# Altium footprint library ConnectorsTDH.PcbLib: 194 footprints (part 3 of 13)
Each footprint in its own frame and in the unit in brackets; x right, y up, seen from the top. Pads: shape width x height; smd on the part's side, far side on the other; paste and mask are expansions set on the pad; w line width, h text height; cw(c..) or ccw(c..) is an arc to the next point about the centre after c.
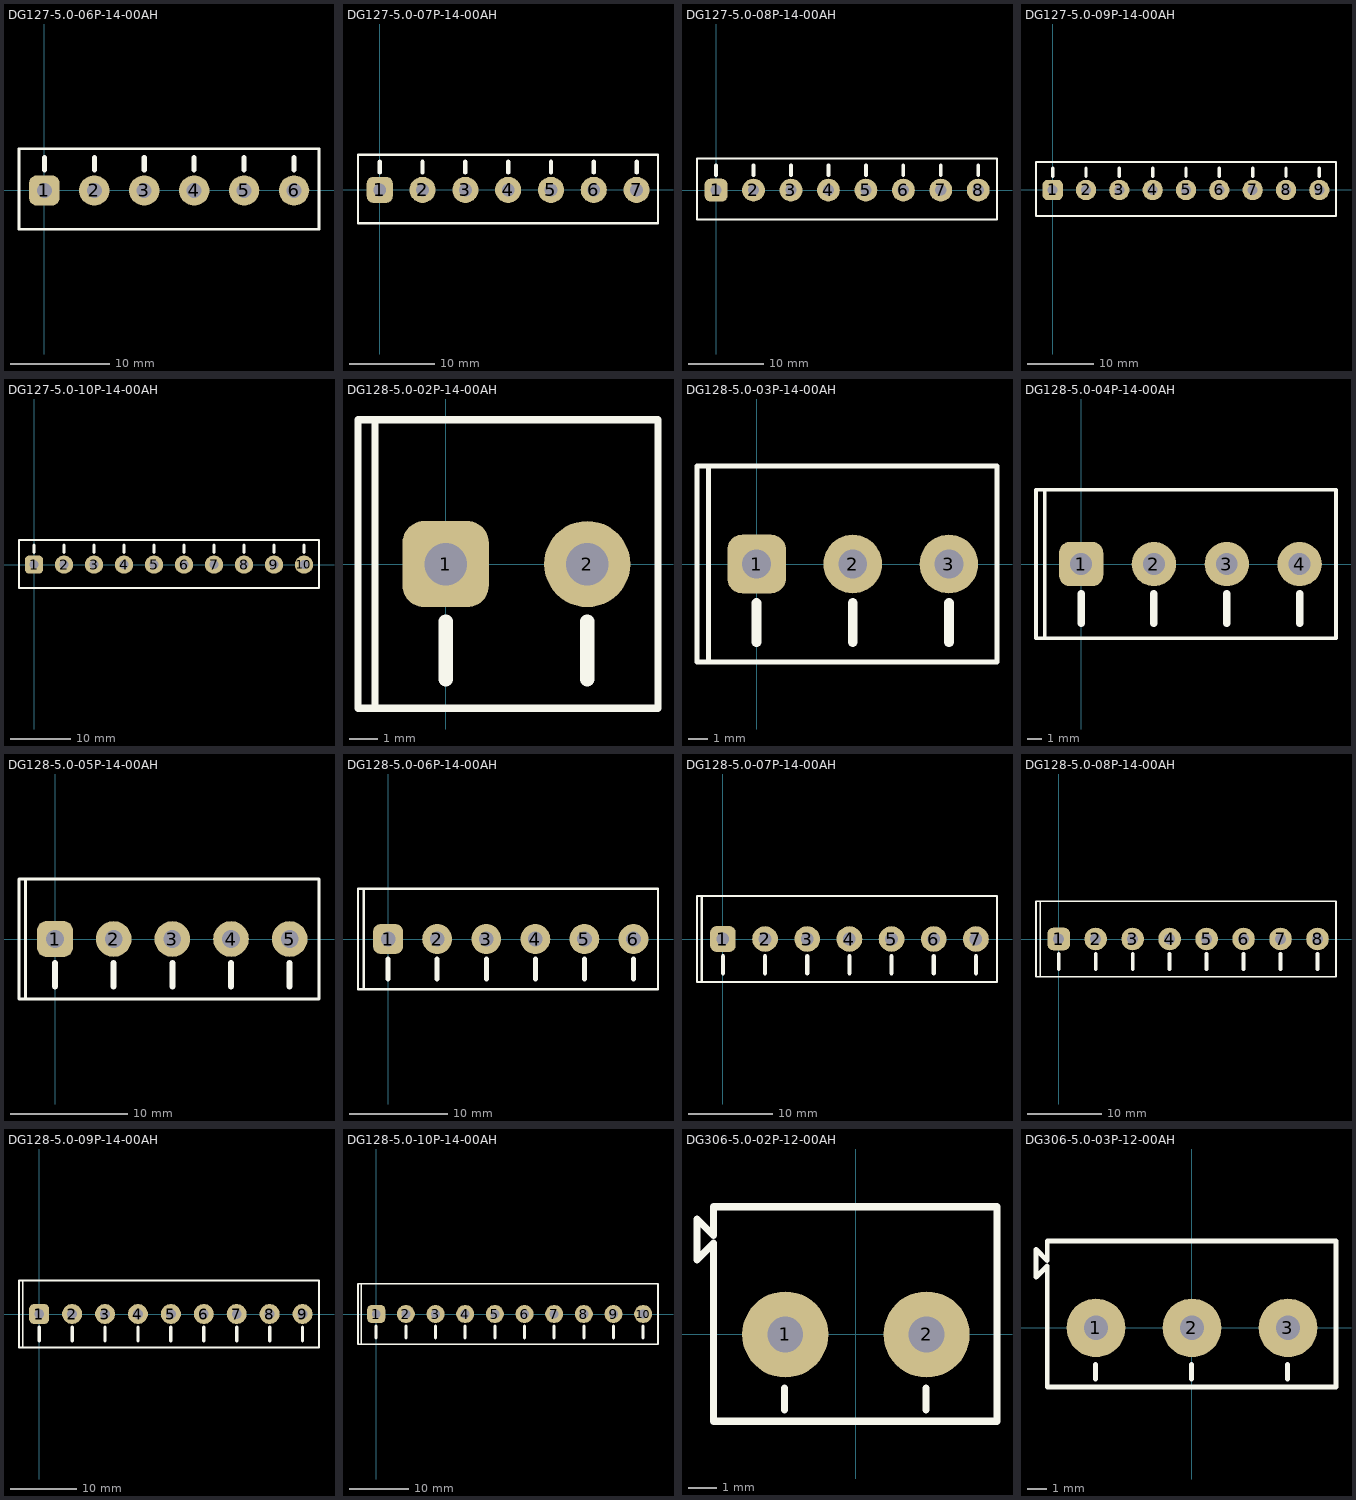
[diagram p2: the footprints below, top view; thin cyan lines are the x and y axes]

## DG127-5.0-06P-14-00AH [mil]
pads (6):
  rrect50% 120x120 hole 59.06: 1(0,0)
  round 120 hole 59.06: 2(196.85,0) 3(393.7,0) 4(590.55,0) 5(787.4,0) 6(984.25,0)
Top Overlay:
  lines w10: -100,-153.54 1082.68,-153.54 1082.68,165.35 -100,165.35 -100,-153.54
  lines w20: 0,80 0,130 ; 196.85,80 196.85,130 ; 393.7,80 393.7,130 ; 590.55,80 590.55,130 ; 787.4,80 787.4,130 ; 984.25,80 984.25,130
3D body "DG127-5.0-06P-14.stp": height 397.64, standoff -145.63, extent -98.43,-153.54 1102.36,165.35

## DG127-5.0-07P-14-00AH [mil]
pads (7):
  rrect50% 120x120 hole 59.06: 1(0,0)
  round 120 hole 59.06: 2(196.85,0) 3(393.7,0) 4(590.55,0) 5(787.4,0) 6(984.25,0) 7(1181.1,0)
Top Overlay:
  lines w10: -100,-153.54 -100,161.42 1279.53,161.42 1279.53,-153.54 -100,-153.54
  lines w20: 0,80 0,130 ; 196.85,80 196.85,130 ; 393.7,80 393.7,130 ; 590.55,80 590.55,130 ; 787.4,80 787.4,130 ; 984.25,80 984.25,130 ; 1181.1,80 1181.1,130
3D body "DG127-5.0-07P-14.stp": height 397.64, standoff -145.63, extent -98.42,-153.54 1299.21,165.35

## DG127-5.0-08P-14-00AH [mil]
pads (8):
  rrect50% 120x120 hole 59.06: 1(0,0)
  round 120 hole 59.06: 2(196.85,0) 3(393.7,0) 4(590.55,0) 5(787.4,0) 6(984.25,0) 7(1181.1,0) 8(1377.95,0)
Top Overlay:
  lines w10: -100,-153.54 1476.38,-153.54 1476.38,165.35 -100,165.35 -100,-153.54
  lines w20: 0,80 0,130 ; 196.85,80 196.85,130 ; 393.7,80 393.7,130 ; 590.55,80 590.55,130 ; 787.4,80 787.4,130 ; 984.25,80 984.25,130 ; 1181.1,80 1181.1,130 ; 1377.95,80 1377.95,130
3D body "DG127-5.0-08P-14.stp": height 397.64, standoff -145.63, extent -98.42,-153.54 1496.06,165.35

## DG127-5.0-09P-14-00AH [mil]
pads (9):
  rrect50% 120x120 hole 59.06: 1(0,0)
  round 120 hole 59.06: 2(196.85,0) 3(393.7,0) 4(590.55,0) 5(787.4,0) 6(984.25,0) 7(1181.1,0) 8(1377.95,0) 9(1574.8,0)
Top Overlay:
  lines w10: -98.43,-153.54 -98.43,165.35 1673.23,165.35 1673.23,-153.54 -98.43,-153.54
  lines w20: 0,80 0,130 ; 196.85,80 196.85,130 ; 393.7,80 393.7,130 ; 590.55,80 590.55,130 ; 787.4,80 787.4,130 ; 984.25,80 984.25,130 ; 1181.1,80 1181.1,130 ; 1377.95,80 1377.95,130 ; 1574.8,80 1574.8,130
3D body "DG127-5.0-09P-14.stp": height 397.64, standoff -145.63, extent -98.43,-153.54 1692.91,165.35

## DG127-5.0-10P-14-00AH [mil]
pads (10):
  rrect50% 120x120 hole 59.06: 1(0,0)
  round 120 hole 59.06: 2(196.85,0) 3(393.7,0) 4(590.55,0) 5(787.4,0) 6(984.25,0) 7(1181.1,0) 8(1377.95,0) 9(1574.8,0) 10(1771.65,0)
Top Overlay:
  lines w10: -98.43,-153.54 -98.43,161.42 1870.08,161.42 1870.08,-153.54 -98.43,-153.54
  lines w20: 0,80 0,130 ; 196.85,80 196.85,130 ; 393.7,80 393.7,130 ; 590.55,80 590.55,130 ; 787.4,80 787.4,130 ; 984.25,80 984.25,130 ; 1181.1,80 1181.1,130 ; 1377.95,80 1377.95,130 ; 1574.8,80 1574.8,130 ; 1771.65,80 1771.65,130
3D body "DG127-5.0-10P-14.stp": height 397.64, standoff -145.63, extent -98.43,-153.54 1889.76,165.35

## DG128-5.0-02P-14-00AH [mil]
pads (2):
  rrect50% 120x120 hole 59.06: 1(0,0)
  round 120 hole 59.06: 2(196.85,0)
Top Overlay:
  lines w10: -98.36,-200.72 -98.36,200.86 ; -98.36,-200.72 -121.98,-200.72 -121.98,200.86 -98.36,200.86 ; -98.36,-200.72 295.34,-200.72 295.34,200.86 -98.36,200.86
  lines w20: 0,-160 0,-80 ; 196.85,-160 196.85,-80
3D body "DG128-5.0-02P-14-00AH.STEP": height 551.18, standoff -137.8, extent -121.62,-205.57 295.7,196

## DG128-5.0-03P-14-00AH [mil]
pads (3):
  rrect50% 120x120 hole 59.06: 1(0,0)
  round 120 hole 59.06: 2(196.85,0) 3(393.7,0)
Top Overlay:
  lines w10: -98.36,-200.72 -98.36,200.86 ; -98.36,-200.72 -121.98,-200.72 -121.98,200.86 -98.36,200.86 ; -98.36,-200.72 492.13,-200.72 492.13,200.86 -98.36,200.86
  lines w20: 0,-160 0,-80 ; 196.85,-160 196.85,-80 ; 393.7,-160 393.7,-80
3D body "DG128-5.0-03P-14-00AH.STEP": height 551.18, standoff -137.8, extent -121.62,-205.57 492.55,196

## DG128-5.0-04P-14-00AH [mil]
pads (4):
  rrect50% 120x120 hole 59.06: 1(0,0)
  round 120 hole 59.06: 2(196.85,0) 3(393.7,0) 4(590.55,0)
Top Overlay:
  lines w10: -98.36,-200.72 -98.36,200.86 ; -98.36,-200.72 -121.98,-200.72 -121.98,200.86 -98.36,200.86 ; -98.36,-200.72 688.98,-200.72 688.98,200.86 -98.36,200.86
  lines w20: 0,-160 0,-80 ; 196.85,-160 196.85,-80 ; 393.7,-160 393.7,-80 ; 590.55,-160 590.55,-80
3D body "DG128-5.0-04P-14-00AH.STEP": height 551.18, standoff -137.8, extent -121.62,-205.57 689.4,196

## DG128-5.0-05P-14-00AH [mil]
pads (5):
  rrect50% 120x120 hole 59.06: 1(0,0)
  round 120 hole 59.06: 2(196.85,0) 3(393.7,0) 4(590.55,0) 5(787.4,0)
Top Overlay:
  lines w10: -98.43,-200.79 885.83,-200.79 885.83,200.79 -98.43,200.79 ; -98.43,-200.79 -98.43,200.79 ; -98.43,-200.79 -120.87,-200.79 -120.87,200.79 -98.43,200.79
  lines w20: 0,-160 0,-80 ; 196.85,-160 196.85,-80 ; 393.7,-160 393.7,-80 ; 590.55,-160 590.55,-80 ; 787.4,-160 787.4,-80
3D body "DG128-5.0-05P-14-00AH.STEP": height 551.18, standoff -137.8, extent -121.62,-205.57 886.26,196

## DG128-5.0-06P-14-00AH [mil]
pads (6):
  rrect50% 120x120 hole 59.06: 1(0,0)
  round 120 hole 59.06: 2(196.85,0) 3(393.7,0) 4(590.55,0) 5(787.4,0) 6(984.25,0)
Top Overlay:
  lines w10: -98.43,-200.79 -98.43,200.79 ; -120.87,-200.79 -74.8,-200.79 1082.68,-200.79 1082.68,200.79 -74.8,200.79 -120.87,200.79 -120.87,-200.79
  lines w20: 0,-160 0,-80 ; 196.85,-160 196.85,-80 ; 393.7,-160 393.7,-80 ; 590.55,-160 590.55,-80 ; 787.4,-160 787.4,-80 ; 984.25,-160 984.25,-80
3D body "DG128-5.0-06P-14-00AH.STEP": height 551.18, standoff -137.8, extent -121.62,-205.57 1083.1,196

## DG128-5.0-07P-14-00AH [mil]
pads (7):
  rrect50% 120x120 hole 59.06: 1(0,0)
  round 120 hole 59.06: 2(196.85,0) 3(393.7,0) 4(590.55,0) 5(787.4,0) 6(984.25,0) 7(1181.1,0)
Top Overlay:
  lines w10: -98.43,-200.79 -98.43,200.79 ; -120.87,-200.79 -120.87,200.79 -74.8,200.79 1279.53,200.79 1279.53,-200.79 -74.8,-200.79 -120.87,-200.79
  lines w20: 0,-160 0,-80 ; 196.85,-160 196.85,-80 ; 393.7,-160 393.7,-80 ; 590.55,-160 590.55,-80 ; 787.4,-160 787.4,-80 ; 984.25,-160 984.25,-80 ; 1181.1,-160 1181.1,-80
3D body "DG128-5.0-07P-14-00AH.STEP": height 551.18, standoff -137.8, extent -121.62,-205.57 1279.96,196

## DG128-5.0-08P-14-00AH [mil]
pads (8):
  rrect50% 120x120 hole 59.06: 1(0,0)
  round 120 hole 59.06: 2(196.85,0) 3(393.7,0) 4(590.55,0) 5(787.4,0) 6(984.25,0) 7(1181.1,0) 8(1377.95,0)
Top Overlay:
  lines w10: -98.43,-200.79 -98.43,200.79 ; -120.87,-200.79 -74.8,-200.79 1476.38,-200.79 1476.38,200.79 -74.8,200.79 -120.87,200.79 -120.87,-200.79
  lines w20: 0,-160 0,-80 ; 196.85,-160 196.85,-80 ; 393.7,-160 393.7,-80 ; 590.55,-160 590.55,-80 ; 787.4,-160 787.4,-80 ; 984.25,-160 984.25,-80 ; 1181.1,-160 1181.1,-80 ; 1377.95,-160 1377.95,-80
3D body "DG128-5.0-08P-14-00AH.STEP": height 551.18, standoff -137.8, extent -121.62,-205.57 1476.81,196

## DG128-5.0-09P-14-00AH [mil]
pads (9):
  rrect50% 120x120 hole 59.06: 1(0,0)
  round 120 hole 59.06: 2(196.85,0) 3(393.7,0) 4(590.55,0) 5(787.4,0) 6(984.25,0) 7(1181.1,0) 8(1377.95,0) 9(1574.8,0)
Top Overlay:
  lines w10: -98.43,-200.79 -98.43,200.79 ; -120.87,-200.79 -120.87,200.79 -74.8,200.79 1673.23,200.79 1673.23,-200.79 -74.8,-200.79 -120.87,-200.79
  lines w20: 0,-160 0,-80 ; 196.85,-160 196.85,-80 ; 393.7,-160 393.7,-80 ; 590.55,-160 590.55,-80 ; 787.4,-160 787.4,-80 ; 984.25,-160 984.25,-80 ; 1181.1,-160 1181.1,-80 ; 1377.95,-160 1377.95,-80 ; 1574.8,-160 1574.8,-80
3D body "DG128-5.0-09P-14-00AH.STEP": height 551.18, standoff -137.8, extent -121.62,-205.57 1673.66,196

## DG128-5.0-10P-14-00AH [mil]
pads (10):
  rrect50% 120x120 hole 59.06: 1(0,0)
  round 120 hole 59.06: 2(196.85,0) 3(393.7,0) 4(590.55,0) 5(787.4,0) 6(984.25,0) 7(1181.1,0) 8(1377.95,0) 9(1574.8,0) 10(1771.65,0)
Top Overlay:
  lines w10: -98.43,-200.79 -98.43,200.79 ; -120.87,-200.79 -120.87,200.79 -74.8,200.79 1870.08,200.79 1870.08,-200.79 -74.8,-200.79 -120.87,-200.79
  lines w20: 0,-160 0,-80 ; 196.85,-160 196.85,-80 ; 393.7,-160 393.7,-80 ; 590.55,-160 590.55,-80 ; 787.4,-160 787.4,-80 ; 984.25,-160 984.25,-80 ; 1181.1,-160 1181.1,-80 ; 1377.95,-160 1377.95,-80 ; 1574.8,-160 1574.8,-80 ; 1771.65,-160 1771.65,-80
3D body "DG128-5.0-10P-14-00AH.STEP": height 551.18, standoff -137.8, extent -121.62,-205.57 1870.51,196

## DG306-5.0-02P-12-00AH [mil] "• Current rating: 10 A AC/DC  • Voltage rating: 300 V AC/DC  • Temperature range: -30° ~ +120°  • Applicable wire: 22-14AWG UL (0.5 - 1.5mm² IEC)"
pads (2):
  round 120 hole 50: 1(-98.43,0) 2(98.43,0)
Top Overlay:
  lines w10: -99.43,-105 -99.43,-75 ; 97.57,-105 97.57,-75 ; -221.43,104 -221.43,161 -198.43,138 -198.43,178 196.57,178 196.57,-121 -198.43,-121 -198.43,127 -221.43,104
3D body "DG306-5.0-02P-12-00AH.STEP": height 393.7, standoff -153.47, extent -221.04,-121.21 196.28,178

## DG306-5.0-03P-12-00AH [mil]
pads (3):
  round 120 hole 50: 1(-196.85,0) 2(0,0) 3(196.85,0)
Top Overlay:
  lines w10: -197.85,-105 -197.85,-75 ; -0.85,-105 -0.85,-75 ; 196,-105 196,-75 ; -319.85,104 -296.85,127 -296.85,-121 295.28,-121 295.28,178 -296.85,178 -296.85,138 -319.85,161 -319.85,104
3D body "DG306-5.0-03P-12-00AH.STEP": height 393.7, standoff -153.47, extent -318.47,-123.21 295.7,176